# Altium footprint library socket_Arduino_CUTPIN.PcbLib: 1 footprints
Each footprint in its own frame and in the unit in brackets; x right, y up, seen from the top. Pads: shape width x height; smd on the part's side, far side on the other; paste and mask are expansions set on the pad; w line width, h text height; cw(c..) or ccw(c..) is an arc to the next point about the centre after c.
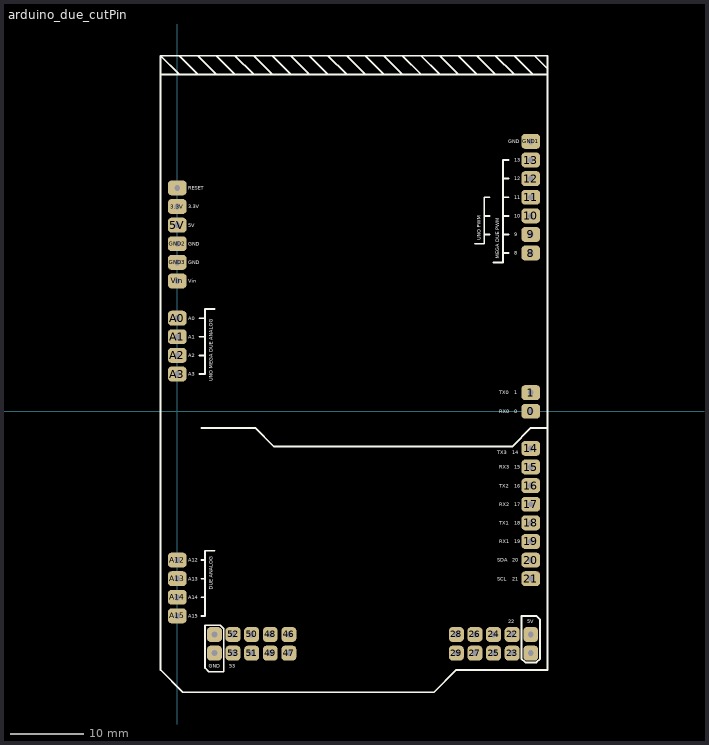
[diagram p0: the footprint, top view; thin cyan lines are the x and y axes]

## arduino_due_cutPin [mil]
pads (51):
  rrect50% 100x80 hole 32: 0(1900,0) 1(1900,100) 3.3V(0,1100) 5V(0,1000) 8(1900,850) 9(1900,950) 10(1900,1050) 11(1900,1150) 12(1900,1250) 13(1900,1350) 14(1900,-200) 15(1900,-300) 16(1900,-400) 17(1900,-500) 18(1900,-600) 19(1900,-700) 20(1900,-800) 21(1900,-900) A0(0,500) A1(0,400) A2(0,300) A3(0,200) A12(0,-800) A13(0,-900) A14(0,-1000) A15(0,-1100) GND1(1900,1450) GND2(0,900) GND3(0,800) RESET(0,1200) Vin(0,700)
  rrect50% 80x80 hole 32: 5V_a(1900,-1200) 5V_b(1900,-1300) 22(1800,-1200) 23(1800,-1300) 24(1700,-1200) 25(1700,-1300) 26(1600,-1200) 27(1600,-1300) 28(1500,-1200) 29(1500,-1300) 46(600,-1200) 47(600,-1300) 48(500,-1200) 49(500,-1300) 50(400,-1200) 51(400,-1300) 52(300,-1200) 53(300,-1300) GND4(200,-1200) GND5(200,-1300)
Top Overlay:
  lines w9.84: 120,200 150,200 150,550 200,550 ; 120,300 150,300 ; 120,400 150,400 ; 120,500 150,500 ; 130,-1100 150,-1100 150,-750 200,-750 ; 130,-1000 150,-1000 ; 130,-900 150,-900 ; 130,-800 150,-800 ; 1600,900 1650,900 1650,1150 1680,1150 ; 1650,950 1680,950 ; 1650,1050 1680,1050 ; 1700,800 1750,800 ; 1750,850 1780,850 ; 1750,950 1780,950 ; 1750,1050 1780,1050 ; 1750,1150 1780,1150 ; 1750,1250 1780,1250 ; 1750,1350 1780,1350
  lines w10: -90,1810 1990,1810 ; 130,-90 420,-90 520,-190 1800,-190 1900,-90 1990,-90 ; 210,1810 110,1910 10,1910 110,1810 10,1810 -90,1910 ; 210,1910 310,1810 ; 310,1910 410,1810 ; 410,1910 510,1810 ; 510,1910 610,1810 ; 610,1910 710,1810 ; 710,1910 810,1810 ; 810,1910 910,1810 ; 910,1910 1010,1810 ; 1010,1910 1110,1810 ; 1110,1910 1210,1810 ; 1210,1910 1310,1810 ; 1310,1910 1410,1810 ; 1410,1910 1510,1810 ; 1510,1910 1610,1810 ; 1610,1910 1710,1810 ; 1710,1910 1810,1810 ; 1750,800 1750,1350 ; 1810,1910 1910,1810 ; 1910,1910 1920,1910 1990,1840 ; -90,1910 1990,1910 1990,-90 ; -90,1910 -90,-310 -90,-1390 30,-1510 1380,-1510 1500,-1390 1990,-1390 1990,-90 ; 150,-1380 150,-1150 230,-1150 250,-1170 250,-1400 170,-1400 150,-1380 ; 1850,-1330 1870,-1350 1930,-1350 1950,-1330 1950,-1120 1930,-1100 1850,-1100 1850,-1330
  text "MEGA DUE PWM" at 1730,820 h20
  text "RX0" at 1730,-10 h20
  text "TX0" at 1730,90 h20
  text "5V" at 1880,-1140 h20
  text "GND" at 170,-1380 h20
  text "53" at 280,-1380 h20
  text "22" at 1780,-1140 h20
  text "SCL" at 1720,-910 h20
  text "SDA" at 1720,-810 h20
  text "RX3" at 1730,-310 h20
  text "RX2" at 1730,-510 h20
  text "RX1" at 1730,-710 h20
  text "TX3" at 1720,-230 h20
  text "TX2" at 1730,-410 h20
  text "TX1" at 1730,-610 h20
  text "21" at 1800,-910 h20
  text "20" at 1800,-810 h20
  text "19" at 1810,-710 h20
  text "18" at 1810,-610 h20
  text "17" at 1810,-510 h20
  text "16" at 1810,-410 h20
  text "15" at 1810,-310 h20
  text "14" at 1800,-230 h20
  text "A15" at 60,-1110 h20
  text "A14" at 60,-1010 h20
  text "A13" at 60,-910 h20
  text "A12" at 60,-810 h20
  text "A3" at 60,190 h20
  text "A2" at 60,290 h20
  text "A1" at 60,390 h20
  text "A0" at 60,490 h20
  text "Vin" at 60,690 h20
  text "GND" at 60,790 h20
  text "GND" at 60,890 h20
  text "5V" at 60,990 h20
  text "3.3V" at 60,1090 h20
  text "RESET" at 60,1190 h20
  text "0" at 1810,-10 h20
  text "1" at 1810,90 h20
  text "8" at 1810,840 h20
  text "9" at 1810,940 h20
  text "10" at 1810,1040 h20
  text "13" at 1810,1340 h20
  text "11" at 1810,1140 h20
  text "12" at 1810,1240 h20
  text "GND" at 1780,1440 h20
  text "UNO PWM" at 1630,920 h20
  text "DUE ANALOG" at 190,-960 h20
  text "UNO MEGA DUE ANALOG" at 190,160 h20
3D body: height 103.11, standoff -351.22, extent -50,850 50,1350
3D body: height 103.11, standoff -351.22, extent -50,650 50,850
3D body: height 103.11, standoff -351.22, extent 1850,800 1950,1600
3D body: height 103.11, standoff -351.22, extent 1850,-949.99 1950,-149.99
3D body: height -15.43, standoff -590.24, extent -80,-1520 2020,2554.01
3D body: height 103.11, standoff -351.22, extent 1850,1600 1950,1800
3D body: height 103.11, standoff -351.22, extent 150,-1350 650,-1250
3D body: height 103.11, standoff -351.22, extent 1450,-1350 1950,-1250
3D body: height 103.11, standoff -351.22, extent 1450,-1250 1950,-1150
3D body: height 103.11, standoff -351.22, extent 150,-1250 650,-1150
3D body: height 103.11, standoff -351.22, extent -50,-1150 50,-950
3D body: height 103.11, standoff -351.22, extent -50,-950 50,-750
3D body: height 103.11, standoff -351.22, extent -50,350 50,550
3D body: height 103.11, standoff -351.22, extent -50,150 50,350
3D body: height 103.11, standoff -351.22, extent 1850,-50 1950,150